# Altium footprint library PcbLib1.PcbLib: 48 footprints (part 3 of 3)
Each footprint in its own frame and in the unit in brackets; x right, y up, seen from the top. Pads: shape width x height; smd on the part's side, far side on the other; paste and mask are expansions set on the pad; w line width, h text height; cw(c..) or ccw(c..) is an arc to the next point about the centre after c.
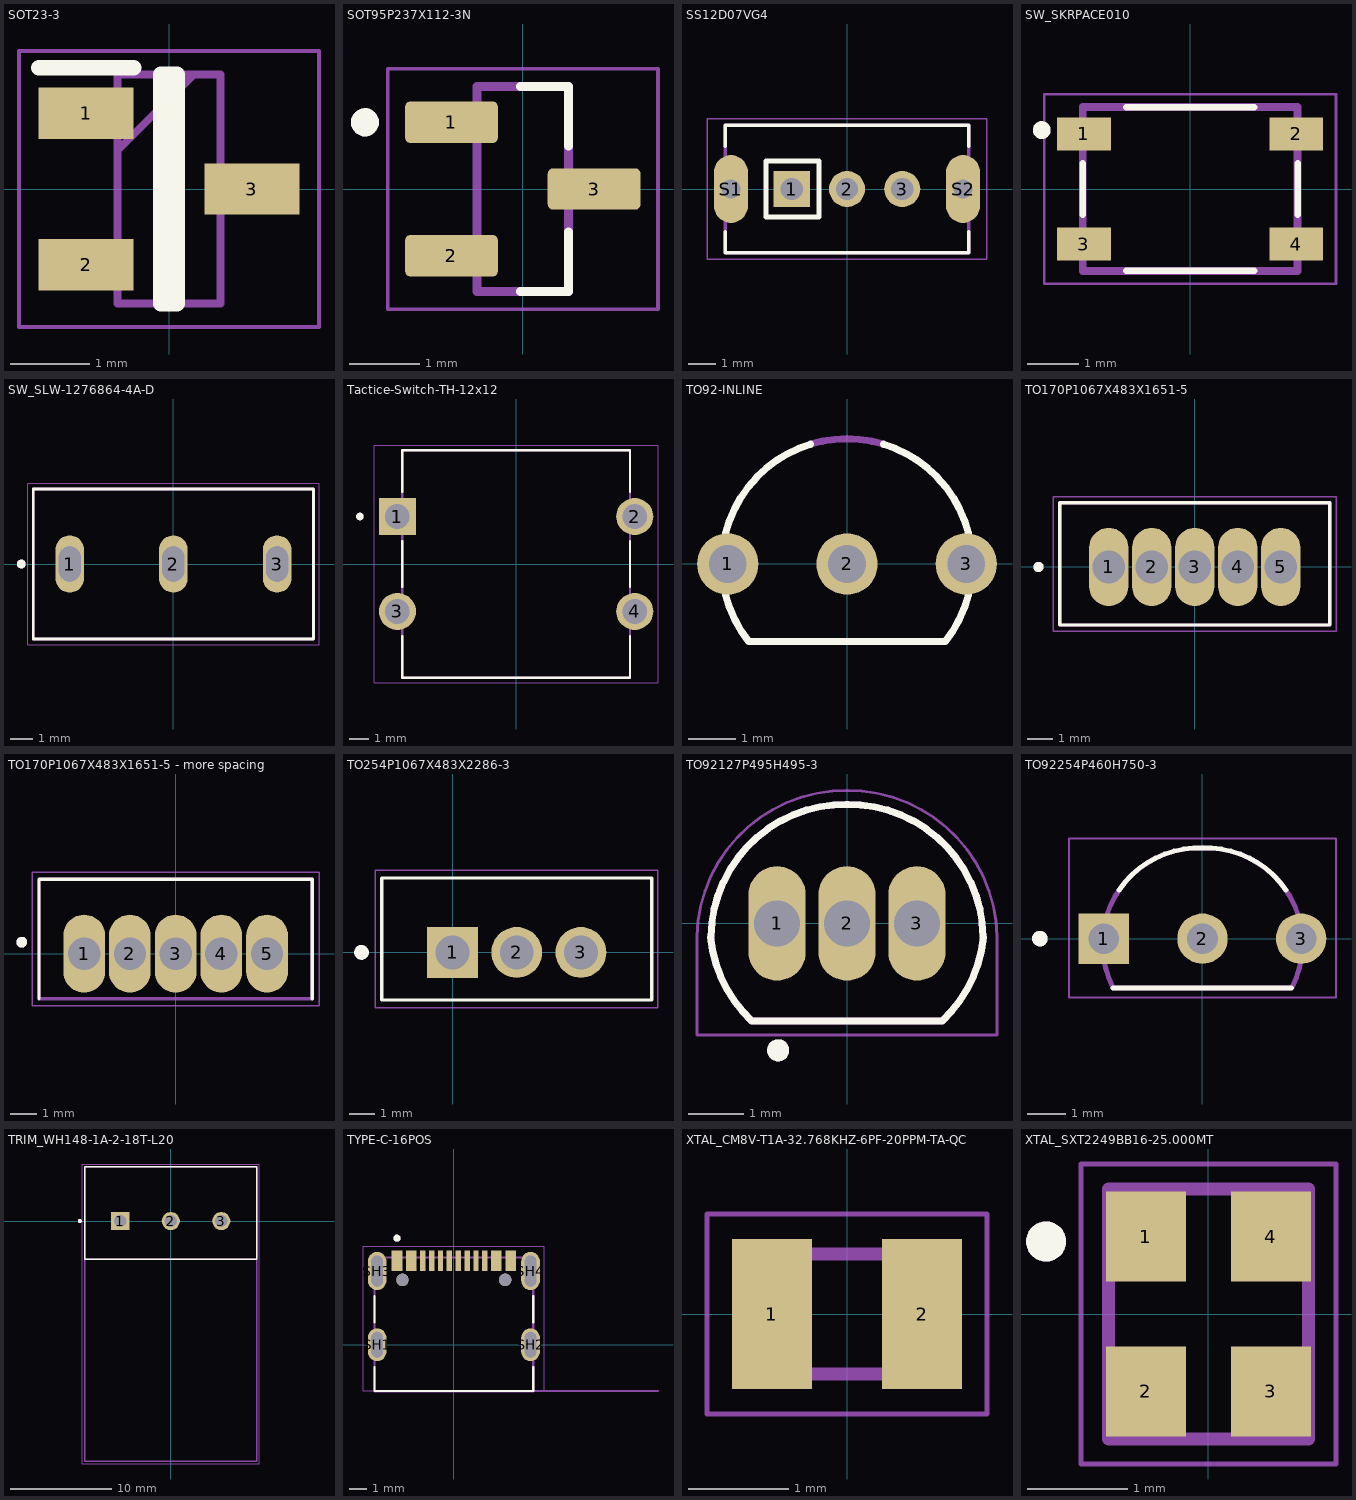
[diagram p2: the footprints below, top view; thin cyan lines are the x and y axes]

## SOT23-3 [mm]
pads (3):
  rect 1.2x0.65 smd: 1(-1.05,0.96) 2(-1.05,-0.96) 3(1.05,0)
Top Overlay:
  lines w0.2: -1.65,1.535 -0.45,1.535 ; -0.1,-1.45 -0.1,1.45 0.1,1.45 0.1,-1.45 -0.1,-1.45
Mechanical 13:
  lines w0.05: -1.9,-1.75 -1.9,1.75 1.9,1.75 1.9,-1.75 -1.9,-1.75
  lines w0.1: -0.65,0.49 0.31,1.45 ; -0.65,-1.45 -0.65,1.45 0.65,1.45 0.65,-1.45 -0.65,-1.45
3D body "step_temp.STEP": height 1.2, standoff 0, extent -1.2,-1.45 1.2,1.45

## SOT95P237X112-3N [mm]
height 1.12
pads (3):
  rrect25% 1.32x0.59 smd: 1(-1.015,0.95) 2(-1.015,-0.95) 3(1.015,0)
Top Overlay:
  circle w0.2: c-2.246,0.95 r0.1
  lines w0.127: -0.035,-1.46 0.65,-1.46 0.65,-0.615 ; -0.035,1.46 0.65,1.46 0.65,0.615
Mechanical 13:
  circle w0.2: c-2.246,0.95 r0.1
  lines w0.127: -0.65,-1.46 -0.65,1.46 0.65,1.46 0.65,-1.46 -0.65,-1.46
Mechanical 15:
  lines w0.05: -1.925,-1.71 -1.925,1.71 1.925,1.71 1.925,-1.71 -1.925,-1.71
3D body "step_temp.STEP": height 1.12, standoff 0, extent -1.188,-1.46 1.188,1.46

## SS12D07VG4 [mm]
height 8.7
pads (5):
  rect 1.308x1.308 / inner round 1.308 / far side rect 1.308x1.308 hole 0.8: 1(-2,0)
  round 1.308 hole 0.8: 2(0,0) 3(2,0)
  oval 1.23x2.46 hole 0.7 square: S1(-4.2,0) S2(4.2,0)
Top Overlay:
  lines w0.127: -4.4,-1.55 -4.4,-2.3 4.4,-2.3 4.4,-1.55 ; -4.4,1.55 -4.4,2.3 4.4,2.3 4.4,1.55
  lines w0.178: -2.926,-1.016 -1.016,-1.016 -1.016,1.016 -2.926,1.016 -2.926,-1.016
Top Courtyard:
  lines w0.05: -5.065,-2.55 5.065,-2.55 5.065,2.55 -5.065,2.55 -5.065,-2.55
Mechanical 13:
  lines w0.127: -4.4,-2.3 -4.4,2.3 4.4,2.3 4.4,-2.3 -4.4,-2.3
3D body "step_temp.STEP": height 8.7, standoff -2.6, extent -4.35,-2.2 4.35,2.2

## SW_SKRPACE010 [mm]
pads (4):
  rect 1.05x0.65 smd: 1(-2.075,1.075) 2(2.075,1.075) 3(-2.075,-1.075) 4(2.075,-1.075)
Top Overlay:
  circle w0.127: c-2.9,1.15 r0.112
  circle w0.127: c-2.85,1.15 r0.05
  lines w0.127: -2.1,-0.5 -2.1,0.5 ; -1.25,-1.6 1.25,-1.6 ; -1.25,1.6 1.25,1.6 ; 2.1,-0.5 2.1,0.5
Mechanical 13:
  lines w0.152: -2.1,-1.6 2.1,-1.6 2.1,1.6 -2.1,1.6 -2.1,-1.6
Mechanical 15:
  lines w0.05: -2.85,-1.85 2.85,-1.85 2.85,1.85 -2.85,1.85 -2.85,-1.85
3D body "SKRPABE010--3DModel-STEP-510211.STEP": height 2.5, standoff 0, extent -2.3,-1.6 2.3,1.6

## SW_SLW-1276864-4A-D [mm]
height 10.6
pads (3):
  oval 1.3x2.6 hole 1 slot 1.6 at 90 deg mask+0.102: 1(-4.7,0) 2(0,0) 3(4.7,0)
Top Overlay:
  circle w0.2: c-6.9,0 r0.1
  lines w0.127: -6.35,-3.4 -6.35,3.4 6.35,3.4 6.35,-3.4 -6.35,-3.4
Mechanical 13:
  circle w0.2: c-6.9,0 r0.1
  lines w0.127: -6.35,-3.4 -6.35,3.4 6.35,3.4 6.35,-3.4 -6.35,-3.4
Mechanical 15:
  lines w0.05: -6.6,-3.65 -6.6,3.65 6.6,3.65 6.6,-3.65 -6.6,-3.65
3D body "step_temp.STEP": height 10.64, standoff -6.56, extent -6.35,-3.3 6.35,3.3

## Tactice-Switch-TH-12x12 [mm]
height 7.5
pads (4):
  rect 1.95x1.95 / inner round 1.95 / far side rect 1.95x1.95 hole 1.3: 1(-6.25,2.5)
  round 1.95 hole 1.3: 2(6.25,2.5) 3(-6.25,-2.5) 4(6.25,-2.5)
Top Overlay:
  circle w0.2: c-8.225,2.5 r0.1
  lines w0.127: -6,-3.795 -6,-6 6,-6 6,-3.795 ; -6,-1.205 -6,1.205 ; -6,3.795 -6,6 6,6 6,3.795 ; 6,-1.205 6,1.205
Mechanical 13:
  circle w0.2: c-8.225,2.5 r0.1
  lines w0.127: -6,-6 -6,6 6,6 6,-6 -6,-6
Mechanical 15:
  lines w0.05: -7.475,-6.25 7.475,-6.25 7.475,6.25 -7.475,6.25 -7.475,-6.25
3D body "step_temp.STEP": height 11.7, standoff -3.8, extent -7,-6 7,6

## TO92-INLINE [mm]
pads (3):
  round 1.308 hole 0.8: 1(-2.54,0) 2(0,0) 3(2.54,0)
Top Overlay:
  lines w0.152: -2.102,-1.642 cw(c0,0) -0.78,2.551 ; -2.095,-1.651 2.095,-1.651 ; 0.78,2.55 cw(c0.001,0) 2.102,-1.642
Mechanical 13:
  lines w0.152: -0.78,2.551 cw(c0,0) 0.78,2.551
3D body "step_temp.STEP": height 5.33, standoff -15.49, extent -2.413,-1.841 2.413,1.841

## TO170P1067X483X1651-5 [mm]
height 16.51
pads (5):
  oval 1.55x3.1 hole 1.3: 1(-3.4,0) 2(-1.7,0) 3(0,0) 4(1.7,0) 5(3.4,0)
Top Overlay:
  circle w0.2: c-6.175,0 r0.1
  lines w0.127: -5.335,-2.29 -5.335,2.54 5.335,2.54 5.335,-2.29 -5.335,-2.29
Mechanical 13:
  circle w0.2: c-6.175,0 r0.1
  lines w0.127: -5.335,-2.29 -5.335,2.54 5.335,2.54 5.335,-2.29 -5.335,-2.29
Mechanical 15:
  lines w0.05: -5.585,-2.54 -5.585,2.775 5.585,2.775 5.585,-2.54 -5.585,-2.54
3D body "step_temp.STEP": height 16.84, standoff -14.73, extent -5.08,-1.651 5.08,2.794

## TO170P1067X483X1651-5 - more spacing [mm]
height 16.51
pads (5):
  oval 1.55x2.9 hole 1.2: 1(-3.4,0) 2(-1.7,0) 3(0,0) 4(1.7,0) 5(3.4,0)
Top Overlay:
  circle w0.2: c-5.723,0.427 r0.1
  lines w0.127: -5.08,-1.677 -5.08,2.768 5.08,2.768 5.08,-1.677
Mechanical 13:
  circle w0.2: c-5.723,0.427 r0.1
  lines w0.127: -5.08,-1.677 5.08,-1.677 5.08,2.768 -5.08,2.768 -5.08,-1.677
Mechanical 15:
  lines w0.05: -5.33,-1.927 5.33,-1.927 5.33,3.017 -5.33,3.017 -5.33,-1.927
3D body "step_temp.STEP": height 16.84, standoff -14.73, extent -5.08,-1.651 5.08,2.794

## TO254P1067X483X2286-3 [mm]
pads (3):
  rect 2.01x2.01 / inner round 2.01 / far side rect 2.01x2.01 hole 1.34: 1(0,0)
  round 2.01 hole 1.34: 2(2.54,0) 3(5.08,0)
Top Overlay:
  circle w0.3: c-3.6,0 r0.141
  lines w0.127: -2.8,-1.885 -2.8,2.945 7.88,2.945 7.88,-1.885 -2.8,-1.885
Mechanical 15:
  lines w0.05: -3.05,-2.2 8.13,-2.2 8.13,3.26 -3.05,3.26 -3.05,-2.2
3D body "step_temp.STEP": height 19.22, standoff -9.68, extent -2.6,-1.5 7.6,3

## TO92127P495H495-3 [mm]
height 4.95
pads (3):
  oval 1.04x2.08 hole 0.84: 1(-1.27,0) 2(0,0) 3(1.27,0)
Top Overlay:
  circle w0.2: c-1.25,-2.305 r0.1
  lines w0.127: -2.476,-0.242 ccw(c-0.116,-0.036) -1.732,-1.769 ; -2.475,-0.24 cw(c-0.028,-0.282) 0.015,2.165 ; -1.725,-1.775 1.725,-1.775 ; -0.015,2.165 cw(c0.028,-0.282) 2.475,-0.24 ; 1.732,-1.769 ccw(c0.116,-0.036) 2.476,-0.242
Mechanical 13:
  circle w0.2: c-1.25,-2.305 r0.1
  lines w0.127: -2.476,-0.242 ccw(c-0.116,-0.036) -1.732,-1.769 ; -2.475,-0.24 cw(c-0.028,-0.282) 0.015,2.165 ; -1.725,-1.775 1.725,-1.775 ; -0.015,2.165 cw(c0.028,-0.282) 2.475,-0.24 ; 1.732,-1.769 ccw(c0.116,-0.036) 2.476,-0.242
Mechanical 15:
  lines w0.05: -2.725,-0.255 -2.725,-2.025 2.725,-2.025 2.725,-0.255 ; -2.725,-0.235 cw(c-0.028,-0.282) 0.02,2.415 ; -0.02,2.415 cw(c0.028,-0.282) 2.725,-0.235
3D body "step_temp.STEP": height 6.47, standoff -13.97, extent -2.276,-1.548 2.283,2.285

## TO92254P460H750-3 [mm]
height 7.5
pads (3):
  rect 1.298x1.298 / inner round 1.298 / far side rect 1.298x1.298 hole 0.79 mask+0.102: 1(-2.54,0)
  round 1.298 hole 0.79 mask+0.102: 2(0,0) 3(2.54,0)
Top Overlay:
  circle w0.2: c-4.189,0 r0.1
  lines w0.127: -2.3,-1.27 2.3,-1.27 ; -2.152,1.247 cw(c-0.111,-0.13) 0.018,2.329 ; -0.018,2.329 cw(c0.111,-0.13) 2.152,1.247
Mechanical 13:
  circle w0.2: c-4.189,0 r0.1
  lines w0.127: -2.308,-1.254 cw(c-0.111,-0.134) 0.018,2.329 ; -2.3,-1.27 2.3,-1.27 ; -0.018,2.329 cw(c0.111,-0.134) 2.308,-1.254
Mechanical 15:
  lines w0.05: -3.439,-1.52 -3.439,2.58 3.439,2.58 3.439,-1.52 -3.439,-1.52
3D body "step_temp.STEP": height 8.41, standoff -8.69, extent -2.74,-1.3 2.74,2.3

## TRIM_WH148-1A-2-18T-L20 [mm]
height 21
pads (3):
  rect 1.8x1.8 / inner round 1.8 / far side rect 1.8x1.8 hole 1.2 mask+0.102: 1(-5,0)
  round 1.8 hole 1.2 mask+0.102: 2(0,0) 3(5,0)
Top Overlay:
  circle w0.2: c-9,0 r0.1
  lines w0.127: -8.5,-3.8 -8.5,5.4 8.5,5.4 8.5,-3.8 -8.5,-3.8
Mechanical 13:
  circle w0.2: c-9,0 r0.1
  lines w0.127: -8.5,-3.8 -8.5,-23.8 8.5,-23.8 8.5,-3.8 ; -8.5,-3.8 -8.5,5.4 8.5,5.4 8.5,-3.8 ; -8.5,-3.8 8.5,-3.8
Mechanical 15:
  lines w0.05: -8.75,-24.05 8.75,-24.05 8.75,5.65 -8.75,5.65 -8.75,-24.05
3D body "step_temp.STEP": height 21, standoff -4, extent -8.5,-23.8 8.5,5.4

## TYPE-C-16POS [mm]
height 3.41
pads (18):
  rect 0.6x1.15 smd: A1_B12(-3.2,4.725) A4_B9(-2.4,4.725) A9_B4(2.4,4.725) A12_B1(3.2,4.725)
  rect 0.3x1.15 smd: A5(-1.25,4.725) A6(-0.25,4.725) A7(0.25,4.725) A8(1.25,4.725) B5(1.75,4.725) B6(0.75,4.725) B7(-0.75,4.725) B8(-1.75,4.725)
  oval 1.05x1.85 hole 0.65 slot 1.45 at 90 deg: SH1(-4.32,0) SH2(4.32,0)
  oval 1.05x2.15 hole 0.65 slot 1.75 at 90 deg: SH3(-4.32,4.15) SH4(4.32,4.15)
  round 0.7 hole 0.7 unplated: ""(-2.89,3.65) ""(2.89,3.65)
Top Overlay:
  circle w0.2: c-3.2,6 r0.1
  lines w0.127: -4.47,-1.25 -4.47,-2.6 4.47,-2.6 4.47,-1.25 ; -4.47,1.25 -4.47,2.75 ; 4.47,1.25 4.47,2.75
Mechanical 13:
  circle w0.2: c-3.2,6 r0.1
  lines w0.127: 11.5,-2.6 4.47,-2.6 ; -4.47,-2.6 4.47,-2.6 ; -4.47,-2.6 -4.47,4.91 4.47,4.91 4.47,-2.6 ; -4.47,-2.6 -4.47,-2.64 4.47,-2.64 4.47,-2.6
  text "PCB EDGE" at 5.5,-2.25 h0.81
Mechanical 15:
  lines w0.05: -5.095,-2.6 5.095,-2.6 5.095,5.55 -5.095,5.55 -5.095,-2.6
3D body "step_temp.STEP": height 3.41, standoff -1.1, extent -4.47,-2.762 4.47,5.048

## XTAL_CM8V-T1A-32.768KHZ-6PF-20PPM-TA-QC [mm]
height 0.6
pads (2):
  rect 0.8x1.5 smd: 1(-0.75,0) 2(0.75,0)
Mechanical 13:
  lines w0.127: -1,-0.6 -1,0.6 1,0.6 1,-0.6 -1,-0.6
Mechanical 15:
  lines w0.05: -1.4,-1 -1.4,1 1.4,1 1.4,-1 -1.4,-1
3D body "step_temp.STEP": height 0.6, standoff 0, extent -1,-0.6 1,0.6

## XTAL_SXT2249BB16-25.000MT [mm]
height 0.65
pads (4):
  rect 0.8x0.9 smd paste+0 mask+0.102: 1(-0.625,0.775) 2(-0.625,-0.775) 3(0.625,-0.775) 4(0.625,0.775)
Top Overlay:
  circle w0.2: c-1.625,0.725 r0.1
Mechanical 13:
  circle w0.2: c-1.625,0.725 r0.1
  lines w0.127: -1,-1.25 -1,1.25 1,1.25 1,-1.25 -1,-1.25
Mechanical 15:
  lines w0.05: -1.275,-1.5 -1.275,1.5 1.275,1.5 1.275,-1.5 -1.275,-1.5
3D body "step_temp.STEP": height 0.65, standoff 0, extent -1,-1.25 1,1.25